# Altium footprint library ECU_AutoRC_r00.PcbLib: 62 footprints (part 4 of 4)
Each footprint in its own frame and in the unit in brackets; x right, y up, seen from the top. Pads: shape width x height; smd on the part's side, far side on the other; paste and mask are expansions set on the pad; w line width, h text height; cw(c..) or ccw(c..) is an arc to the next point about the centre after c.
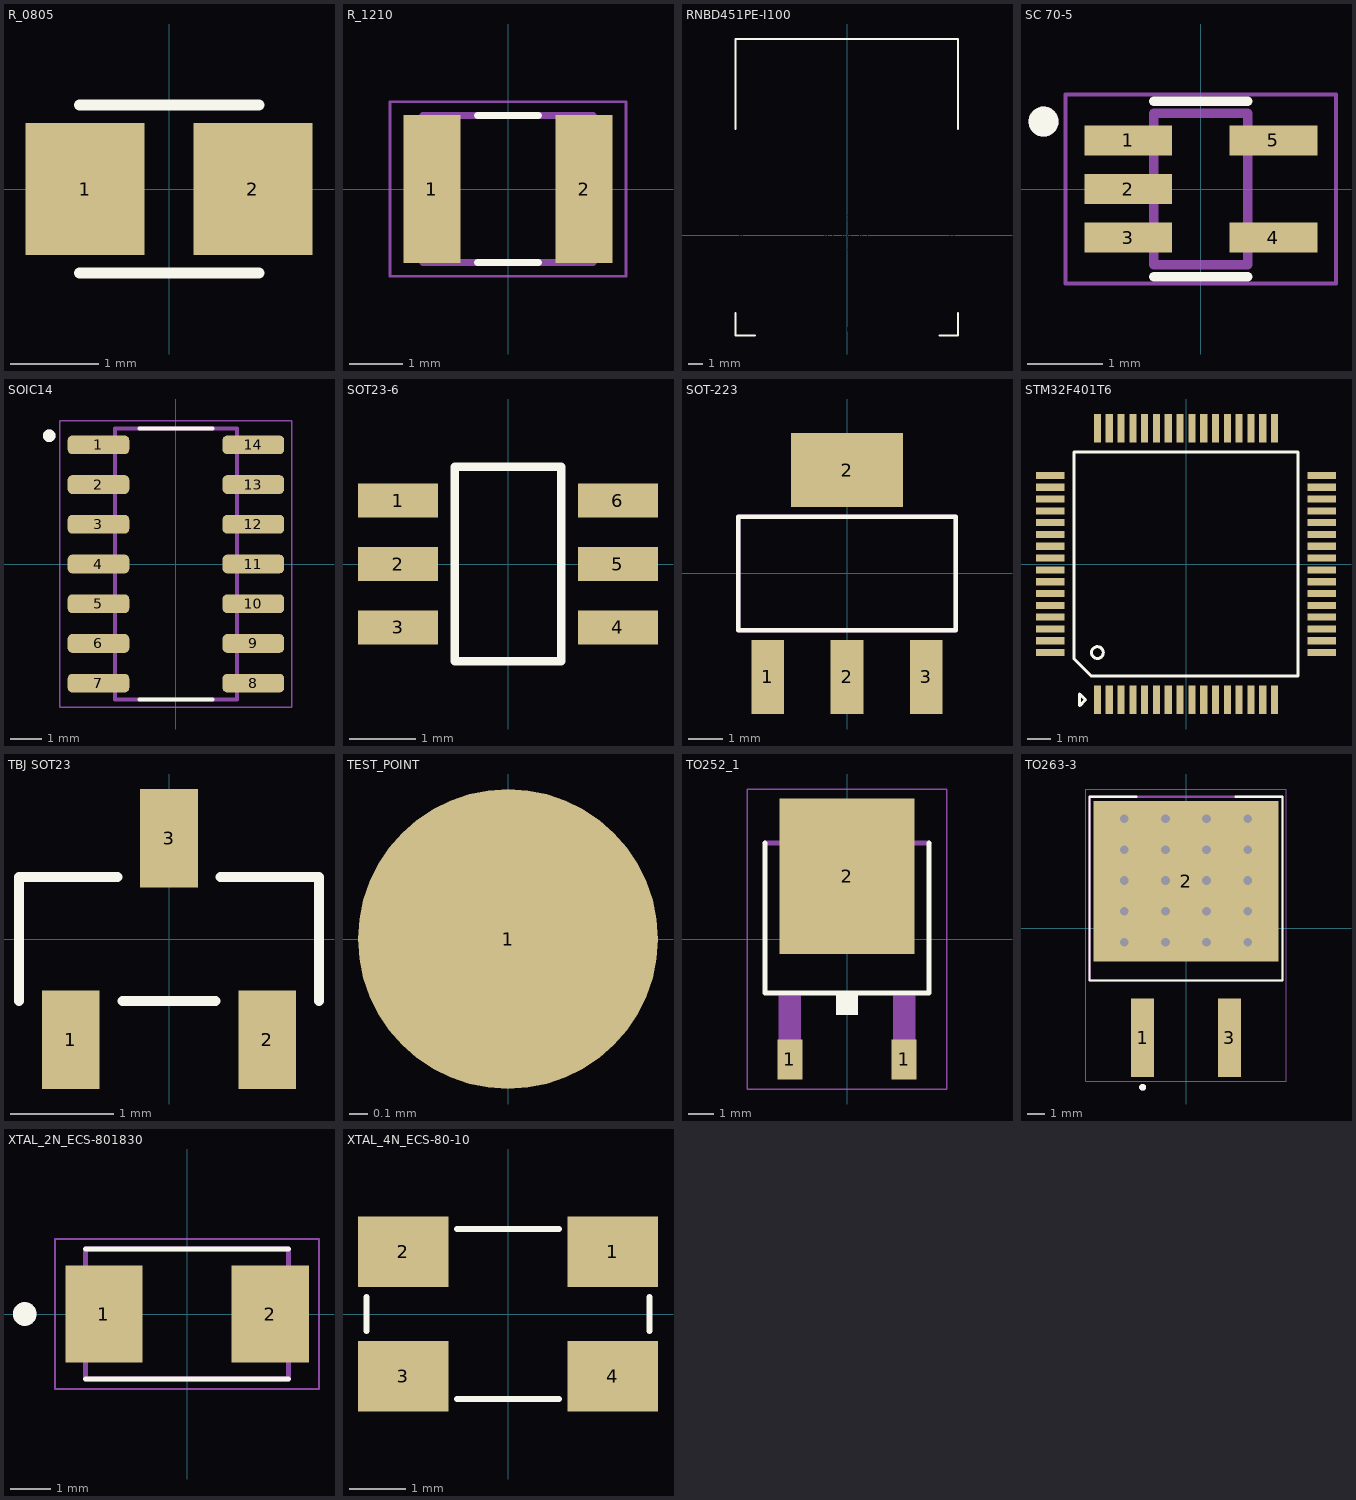
[diagram p3: the footprints below, top view; thin cyan lines are the x and y axes]

## R_0805 [mm] "Chip Resistor, 2-Leads, Body 2.00x1.25mm, IPC Low Density"
height 0.65
pads (2):
  rect 1.35x1.5 smd: 1(-0.95,0) 2(0.95,0)
Top Overlay:
  lines w0.127: -1.016,-0.953 1.016,-0.953 ; -1.016,0.953 1.016,0.953
3D body "User Library-CR2012-0805.STEP": height 0.6, standoff 0, extent -1,-0.625 1,0.625

## R_1210 [mm]
pads (2):
  rect 1.07x2.77 smd: 1(-1.43,0) 2(1.43,0)
Top Overlay:
  lines w0.127: -0.57,-1.38 0.57,-1.38 ; -0.57,1.38 0.57,1.38
Mechanical 13:
  lines w0.127: -1.6,-1.38 -1.6,1.38 1.6,1.38 1.6,-1.38 -1.6,-1.38
Mechanical 15:
  lines w0.05: -2.215,-1.635 -2.215,1.635 2.215,1.635 2.215,-1.635 -2.215,-1.635
3D body "step_temp.STEP": height 0.65, standoff 0, extent -1.55,-1.3 1.55,1.3

## RNBD451PE-I100 [mm]
pads (48):
  rect 1.3x0.7 on Top Solder: 1(-7.4,7) 2(-7.4,6) 3(-7.4,5) 4(-7.4,4) 5(-7.4,3) 6(-7.4,2) 7(-7.4,1) 8(-7.4,0) 9(-7.4,-1) 10(-7.4,-2) 11(-7.4,-3) 12(-7.4,-4) 13(-7.4,-5) 27(7.4,-5) 28(7.4,-4) 29(7.4,-3) 30(7.4,-2) 31(7.4,-1) 32(7.4,0) 33(7.4,1) 34(7.4,2) 35(7.4,3) 36(7.4,4) 37(7.4,5) 38(7.4,6) 39(7.4,7)
  rect 0.7x1.3 on Top Solder: 14(-6,-6.65) 15(-5,-6.65) 16(-4,-6.65) 17(-3,-6.65) 18(-2,-6.65) 19(-1,-6.65) 20(0,-6.65) 21(1,-6.65) 22(2,-6.65) 23(3,-6.65) 24(4,-6.65) 25(5,-6.65) 26(6,-6.65)
  rect 0.9x0.9 on Top Solder: 40(-1.2,1.2) 41(0,1.2) 42(1.2,1.2) 43(-1.2,0) 44(0,0) 45(1.2,0) 46(-1.2,-1.2) 47(0,-1.2) 48(1.2,-1.2)
Top Overlay:
  lines w0.127: -7.85,-7.045 -7.85,-5.475 ; -7.85,7.475 -7.85,13.8 7.8,13.8 7.8,7.475 ; -7.84,-7.05 -6.475,-7.05 ; 6.5,-7.05 7.8,-7.05 7.8,-5.475
3D body "WBZ451_LGA_REV3P0-WOUFL.step": height 3, standoff 0.1, extent -7.775,-6.975 7.725,13.725

## SC 70-5 [mm]
height 1.1
pads (5):
  rect 1.17x0.4 smd: 1(-0.97,0.65) 2(-0.97,0) 3(-0.97,-0.65) 4(0.97,-0.65) 5(0.97,0.65)
Top Overlay:
  circle w0.2: c-2.1,0.9 r0.1
  lines w0.127: -0.625,-1.17 0.625,-1.17 ; -0.625,1.17 0.625,1.17
Mechanical 13:
  circle w0.2: c-2.1,0.9 r0.1
  lines w0.127: -0.625,-1.012 -0.625,1.012 0.625,1.012 0.625,-1.012 -0.625,-1.012
Mechanical 15:
  lines w0.05: -1.805,-1.262 -1.805,1.262 1.805,1.262 1.805,-1.262 -1.805,-1.262
3D body "step_temp.STEP": height 1.1, standoff 0, extent -1.05,-1 1.05,1

## SOIC14 [mm]
pads (14):
  rrect50% 1.97x0.6 smd: 1(-2.475,3.81) 2(-2.475,2.54) 3(-2.475,1.27) 4(-2.475,0) 5(-2.475,-1.27) 6(-2.475,-2.54) 7(-2.475,-3.81) 8(2.475,-3.81) 9(2.475,-2.54) 10(2.475,-1.27) 11(2.475,0) 12(2.475,1.27) 13(2.475,2.54) 14(2.475,3.81)
Top Overlay:
  circle w0.2: c-4.05,4.1 r0.1
  lines w0.127: -1.17,-4.325 1.17,-4.325 ; -1.17,4.325 1.17,4.325
Mechanical 13:
  circle w0.2: c-4.05,4.1 r0.1
  lines w0.127: -1.95,-4.325 -1.95,4.325 1.95,4.325 1.95,-4.325 -1.95,-4.325
Mechanical 15:
  lines w0.05: -3.71,-4.575 -3.71,4.575 3.71,4.575 3.71,-4.575 -3.71,-4.575
3D body "step_temp.STEP": height 1.75, standoff 0, extent -3,-4.325 3,4.325

## SOT23-6 [mm]
pads (6):
  rect 1.2x0.51 smd: 1(-1.65,0.95) 2(-1.65,0) 3(-1.65,-0.95) 4(1.65,-0.95) 5(1.65,0) 6(1.65,0.95)
Top Overlay:
  lines w0.127: -0.8,-1.46 0.8,-1.46 0.8,1.46 -0.8,1.46 -0.8,-1.46
3D body "usblc6-2sc6y.stp": height 1.18, standoff 0, extent -1.4,-1.44 1.4,1.456

## SOT-223 [mm]
pads (4):
  rect 0.95x2.15 smd: 1(-2.3,-3) 2(0,-3) 3(2.3,-3)
  rect 3.25x2.15 smd: 2(0,3)
Top Overlay:
  lines w0.127: -3.15,-1.65 -3.15,1.65 3.15,1.65 3.15,-1.65 -3.15,-1.65
Mechanical 13:
  lines w0.127: -3.15,-1.65 -3.15,1.65 3.15,1.65 3.15,-1.65 -3.15,-1.65
3D body "LD1117S33CTR--3DModel-STEP-418109.STEP": height 1.71, standoff -0.09, extent -3.25,-3.499 3.25,3.499

## STM32F401T6 [mm]
pads (64):
  rect 0.3x1.2 smd: 1(-3.75,-5.75) 2(-3.25,-5.75) 3(-2.75,-5.75) 4(-2.25,-5.75) 5(-1.75,-5.75) 6(-1.25,-5.75) 7(-0.75,-5.75) 8(-0.25,-5.75) 9(0.25,-5.75) 10(0.75,-5.75) 11(1.25,-5.75) 12(1.75,-5.75) 13(2.25,-5.75) 14(2.75,-5.75) 15(3.25,-5.75) 16(3.75,-5.75) 33(3.75,5.75) 34(3.25,5.75) 35(2.75,5.75) 36(2.25,5.75) 37(1.75,5.75) 38(1.25,5.75) 39(0.75,5.75) 40(0.25,5.75) 41(-0.25,5.75) 42(-0.75,5.75) 43(-1.25,5.75) 44(-1.75,5.75) 45(-2.25,5.75) 46(-2.75,5.75) 47(-3.25,5.75) 48(-3.75,5.75)
  rect 1.2x0.3 smd: 17(5.75,-3.75) 18(5.75,-3.25) 19(5.75,-2.75) 20(5.75,-2.25) 21(5.75,-1.75) 22(5.75,-1.25) 23(5.75,-0.75) 24(5.75,-0.25) 25(5.75,0.25) 26(5.75,0.75) 27(5.75,1.25) 28(5.75,1.75) 29(5.75,2.25) 30(5.75,2.75) 31(5.75,3.25) 32(5.75,3.75) 49(-5.75,3.75) 50(-5.75,3.25) 51(-5.75,2.75) 52(-5.75,2.25) 53(-5.75,1.75) 54(-5.75,1.25) 55(-5.75,0.75) 56(-5.75,0.25) 57(-5.75,-0.25) 58(-5.75,-0.75) 59(-5.75,-1.25) 60(-5.75,-1.75) 61(-5.75,-2.25) 62(-5.75,-2.75) 63(-5.75,-3.25) 64(-5.75,-3.75)
Top Overlay:
  circle w0.127: c-3.75,-3.75 r0.25
  lines w0.127: -4.25,-5.75 -4.25,-5.75 ; -4.25,-5.75 -4.5,-6 -4.5,-5.5 -4.25,-5.75 ; -4.25,-5.75 -4.25,-5.75 ; -4.75,-4 -4.75,4.75 4.75,4.75 4.75,-4.75 -4,-4.75 -4.75,-4
3D body "User Library-LQFP64-0_5.STEP": height 1.55, standoff -0.02, extent -5.886,-5.886 5.886,5.886

## TBJ SOT23 [mm]
pads (3):
  rect 0.56x0.95 smd: 1(-0.95,-0.975) 2(0.95,-0.975) 3(0,0.975)
Top Overlay:
  lines w0.1: -1.45,-0.6 -1.45,0.6 -0.5,0.6 ; -0.45,-0.6 0.45,-0.6 ; 0.5,0.6 1.45,0.6 1.45,-0.6
3D body "MMBT3906LT1G.STEP": height 1.11, standoff 0, extent -1.45,-1.2 1.45,1.2

## TEST_POINT [mm]
pads (1):
  round 1.6 smd mask-2539.97: 1(0,0)
Top Solder:
  circle w0.85: c0,0 r0.425

## TO252_1 [mm]
pads (3):
  rect 1x1.6 smd: 1(-2.28,-4.8) 1(2.28,-4.8)
  rect 5.4x6.2 smd: 2(0,2.5)
Top Overlay:
  region: 0.432,-3.023 -0.432,-3.023 -0.432,-2.261 0.432,-2.261
  lines w0.203: -3.277,3.835 -3.277,-2.159 3.277,-2.159 3.277,3.835
Mechanical 13:
  region: 2.565,4.648 2.565,3.937 -2.565,3.937 -2.565,4.648 -2.108,5.105 2.108,5.105
  region: 2.718,-5.156 1.854,-5.156 1.854,-2.261 2.718,-2.261
  region: -1.854,-5.156 -2.718,-5.156 -2.718,-2.261 -1.854,-2.261
  lines w0.203: -3.277,3.835 3.277,3.835 ; -2.565,3.937 2.565,3.937 2.565,4.648 2.108,5.105 -2.108,5.105 -2.565,4.648 -2.565,3.937
Mechanical 15:
  lines w0.051: -3.973,-5.983 -3.973,5.983 3.973,5.983 3.973,-5.983 -3.973,-5.983
3D body "step_temp.STEP": height 2.4, standoff 0, extent -3.25,-4.925 3.25,4.8

## TO263-3 [mm]
pads (3):
  rect 1.35x4.6 smd: 1(-2.54,-6.4) 3(2.54,-6.4)
  rect 10.8x9.4 smd paste-5: 2(0,2.75)
via -3.6,6.4 diameter 0.7 hole 0.5
via -3.6,4.6 diameter 0.7 hole 0.5
via -3.6,2.8 diameter 0.7 hole 0.5
via -3.6,1 diameter 0.7 hole 0.5
via -3.6,-0.8 diameter 0.7 hole 0.5
via -1.2,6.4 diameter 0.7 hole 0.5
via -1.2,4.6 diameter 0.7 hole 0.5
via -1.2,2.8 diameter 0.7 hole 0.5
via -1.2,1 diameter 0.7 hole 0.5
via -1.2,-0.8 diameter 0.7 hole 0.5
via 1.2,6.4 diameter 0.7 hole 0.5
via 1.2,4.6 diameter 0.7 hole 0.5
via 1.2,2.8 diameter 0.7 hole 0.5
via 1.2,1 diameter 0.7 hole 0.5
via 1.2,-0.8 diameter 0.7 hole 0.5
via 3.6,6.4 diameter 0.7 hole 0.5
via 3.6,4.6 diameter 0.7 hole 0.5
via 3.6,2.8 diameter 0.7 hole 0.5
via 3.6,1 diameter 0.7 hole 0.5
via 3.6,-0.8 diameter 0.7 hole 0.5
Top Overlay:
  circle w0.2: c-2.54,-9.29 r0.1
  lines w0.127: -2.9,7.7 -5.65,7.7 -5.65,-3.043 5.65,-3.043 5.65,7.7 2.9,7.7
Top Paste:
  rectangle: -4.5,5.7 -2.7,7.1
  rectangle: -4.5,3.9 -2.7,5.3
  rectangle: -4.5,2.1 -2.7,3.5
  rectangle: -4.5,0.3 -2.7,1.7
  rectangle: -4.5,-1.5 -2.7,-0.1
  rectangle: -2.1,5.7 -0.3,7.1
  rectangle: -2.1,3.9 -0.3,5.3
  rectangle: -2.1,2.1 -0.3,3.5
  rectangle: -2.1,0.3 -0.3,1.7
  rectangle: -2.1,-1.5 -0.3,-0.1
  rectangle: 0.3,5.7 2.1,7.1
  rectangle: 0.3,3.9 2.1,5.3
  rectangle: 0.3,2.1 2.1,3.5
  rectangle: 0.3,0.3 2.1,1.7
  rectangle: 0.3,-1.5 2.1,-0.1
  rectangle: 2.7,5.7 4.5,7.1
  rectangle: 2.7,3.9 4.5,5.3
  rectangle: 2.7,2.1 4.5,3.5
  rectangle: 2.7,0.3 4.5,1.7
  rectangle: 2.7,-1.5 4.5,-0.1
Mechanical 13:
  circle w0.2: c-2.54,-9.29 r0.1
  lines w0.127: -5.65,-3.043 -5.65,7.7 5.65,7.7 5.65,-3.043 -5.65,-3.043
Mechanical 15:
  lines w0.05: -5.85,-8.95 -5.85,8.15 5.85,8.15 5.85,-8.95 -5.85,-8.95
3D body "Infineon-STP_PG-TO263-3-2-P-v01_00-EN.stp": height 4.41, standoff -0.1, extent -5,-8.13 5,6.82

## XTAL_2N_ECS-801830 [mm]
pads (2):
  rect 1.9x2.4 smd: 1(-2.05,0) 2(2.05,0)
Top Overlay:
  circle w0.3: c-4,0 r0.141
  lines w0.127: -2.5,-1.6 2.5,-1.6 ; -2.5,1.6 2.5,1.6
Mechanical 13:
  circle w0.3: c-4,0 r0.141
  lines w0.127: -2.5,-1.6 -2.5,1.6 2.5,1.6 2.5,-1.6 -2.5,-1.6
Mechanical 15:
  lines w0.05: -3.25,-1.85 -3.25,1.85 3.25,1.85 3.25,-1.85 -3.25,-1.85
3D body "ECS-80-18-30-JGN-TR.STEP": height 1.4, standoff 0, extent -2.5,-1.6 2.5,1.6

## XTAL_4N_ECS-80-10 [mm]
pads (4):
  rect 1.6x1.25 smd: 1(1.85,1.1) 2(-1.85,1.1) 3(-1.85,-1.1) 4(1.85,-1.1)
Top Overlay:
  lines w0.102: -2.5,-0.3 -2.5,0.3 ; -0.9,-1.5 0.9,-1.5 ; -0.9,1.5 0.9,1.5 ; 2.5,-0.3 2.5,0.3
3D body "ABM3C.STEP": height 1.3, standoff 0, extent -2.5,-1.6 2.5,1.6